# Altium integrated library connecteur 4.IntLib: 120 symbols (continued)
## WE-WR-MM Female Angled Connector with Polarization 690368172672 (continued)
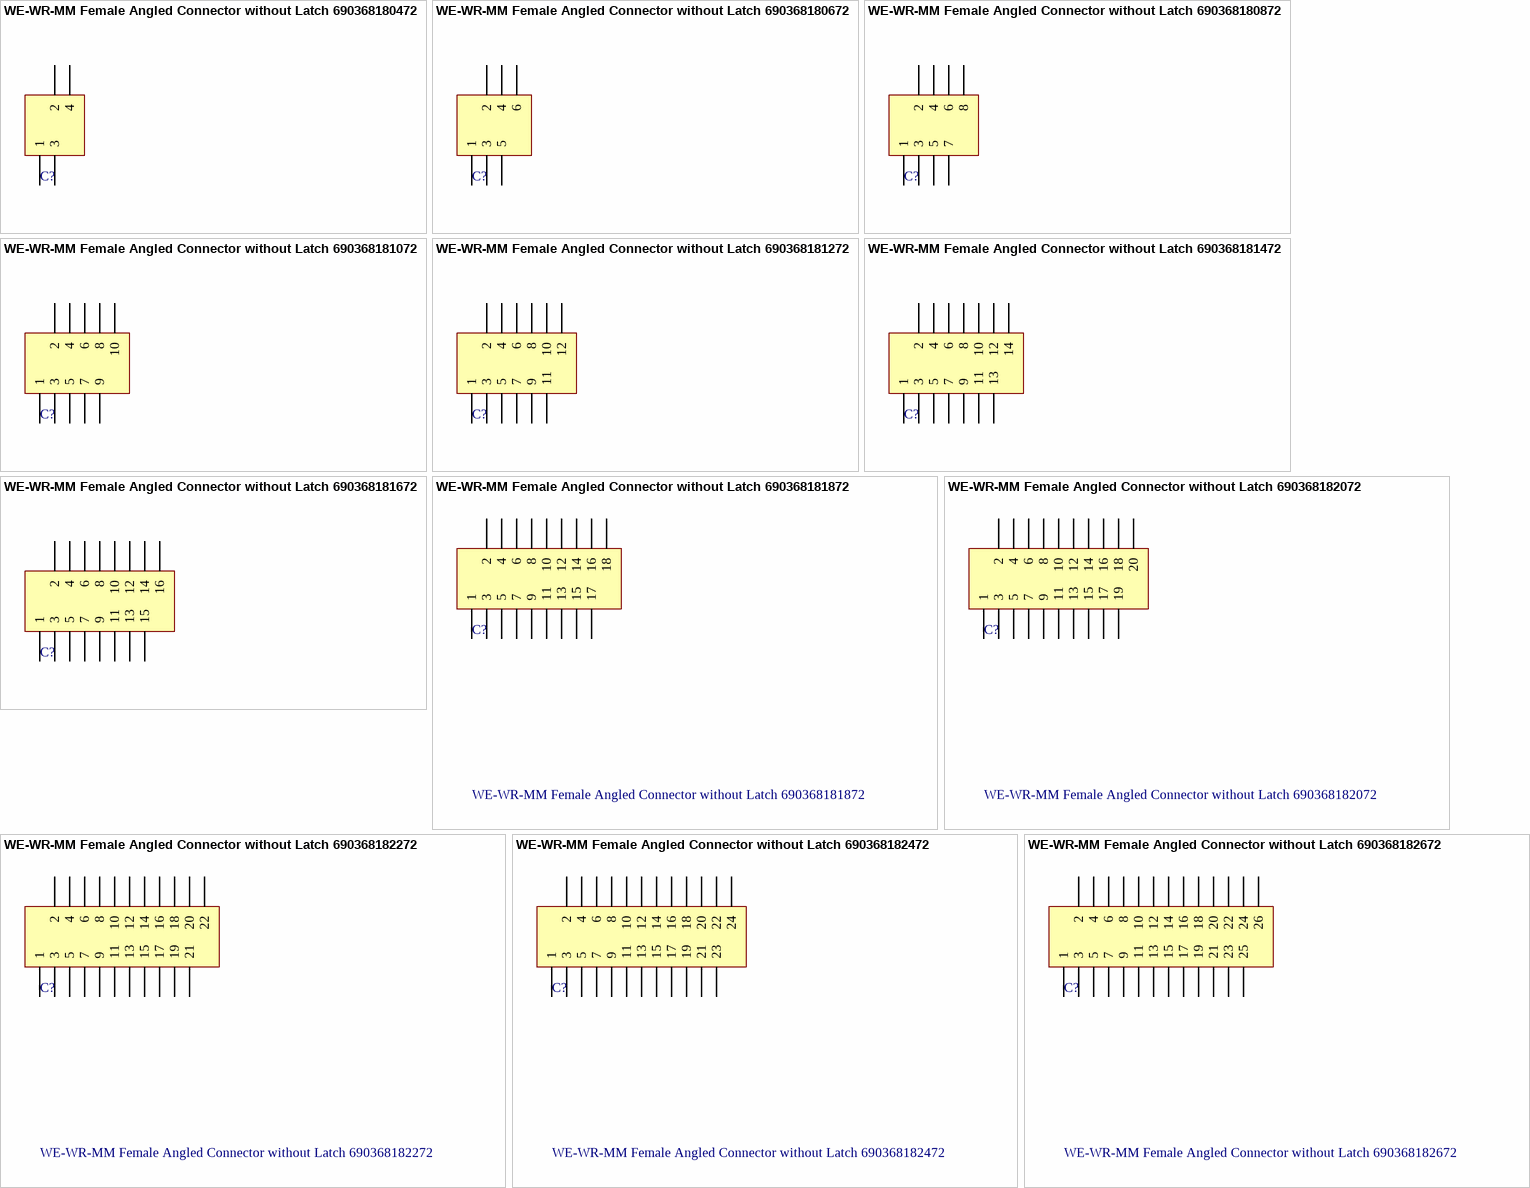
[diagram p5: symbols WE-WR-MM Female Angled Connector without Latch 690368180472 to WE-WR-MM Female Angled Connector without Latch 690368182672]

## WE-WR-MM Female Angled Connector without Latch 690368180472
designator C?
WR-MM Female Angled Connector without Latch; Manufacturer: Würth Elektronik eiSos GmbH; ComponentLink1 Description: Manufacturer; ComponentLink2 Description: Datasheet; NoPins: 4; Created Date: 18 April 2013; partNo: 690368180472; ComponentLink1URL: http://www.we-online.com; ComponentLink2URL: http://katalog.we-online.de/em/datasheet/69036818xx72.pdf; Created by: Karrer Zheng
footprint 690368180472 (without Polarization, 4 pins, right angled)
pins: 1, 2, 3, 4

## WE-WR-MM Female Angled Connector without Latch 690368180672
designator C?
WR-MM Female Angled Connector without Latch; Manufacturer: Würth Elektronik eiSos GmbH; ComponentLink1 Description: Manufacturer; ComponentLink2 Description: Datasheet; NoPins: 6; Created Date: 18 April 2013; partNo: 690368180672; ComponentLink1URL: http://www.we-online.com; ComponentLink2URL: http://katalog.we-online.de/em/datasheet/69036818xx72.pdf; Created by: Karrer Zheng
footprint 690368180672 (without Polarization, 6 pins, right angled)
pins: 1, 2, 3, 4, 5, 6

## WE-WR-MM Female Angled Connector without Latch 690368180872
designator C?
WR-MM Female Angled Connector without Latch; Manufacturer: Würth Elektronik eiSos GmbH; ComponentLink1 Description: Manufacturer; ComponentLink2 Description: Datasheet; NoPins: 8; Created Date: 18 April 2013; partNo: 690368180872; ComponentLink1URL: http://www.we-online.com; ComponentLink2URL: http://katalog.we-online.de/em/datasheet/69036818xx72.pdf; Created by: Karrer Zheng
footprint 690368180872 (without Polarization, 8 pins, right angled)
pins: 1, 2, 3, 4, 5, 6, 7, 8

## WE-WR-MM Female Angled Connector without Latch 690368181072
designator C?
WR-MM Female Angled Connector without Latch; Manufacturer: Würth Elektronik eiSos GmbH; ComponentLink1 Description: Manufacturer; ComponentLink2 Description: Datasheet; NoPins: 10; Created Date: 18 April 2013; partNo: 690368181072; ComponentLink1URL: http://www.we-online.com; ComponentLink2URL: http://katalog.we-online.de/em/datasheet/69036818xx72.pdf; Created by: Karrer Zheng
footprint 690368181072 (without Polarization, 10 pins, right angled)
pins: 1, 2, 3, 4, 5, 6, 7, 8, 9, 10

## WE-WR-MM Female Angled Connector without Latch 690368181272
designator C?
WR-MM Female Angled Connector without Latch; Manufacturer: Würth Elektronik eiSos GmbH; ComponentLink1 Description: Manufacturer; ComponentLink2 Description: Datasheet; NoPins: 12; Created Date: 18 April 2013; partNo: 690368181272; ComponentLink1URL: http://www.we-online.com; ComponentLink2URL: http://katalog.we-online.de/em/datasheet/69036818xx72.pdf; Created by: Karrer Zheng
footprint 690368181272 (without Polarization, 12 pins, right angled)
pins: 1, 2, 3, 4, 5, 6, 7, 8, 9, 10, 11, 12

## WE-WR-MM Female Angled Connector without Latch 690368181472
designator C?
WR-MM Female Angled Connector without Latch; Manufacturer: Würth Elektronik eiSos GmbH; ComponentLink1 Description: Manufacturer; ComponentLink2 Description: Datasheet; NoPins: 14; Created Date: 18 April 2013; partNo: 690368181472; ComponentLink1URL: http://www.we-online.com; ComponentLink2URL: http://katalog.we-online.de/em/datasheet/69036818xx72.pdf; Created by: Karrer Zheng
footprint 690368181472 (without Polarization,14 pins, right angled)
pins: 1, 2, 3, 4, 5, 6, 7, 8, 9, 10, 11, 12, 13, 14

## WE-WR-MM Female Angled Connector without Latch 690368181672
designator C?
WR-MM Female Angled Connector without Latch; Manufacturer: Würth Elektronik eiSos GmbH; ComponentLink1 Description: Manufacturer; ComponentLink2 Description: Datasheet; NoPins: 16; Created Date: 18 April 2013; partNo: 690368181672; ComponentLink1URL: http://www.we-online.com; ComponentLink2URL: http://katalog.we-online.de/em/datasheet/69036818xx72.pdf; Created by: Karrer Zheng
footprint 690368181672 (without Polarization, 16 pins, right angled)
pins: 1, 2, 3, 4, 5, 6, 7, 8, 9, 10, 11, 12, 13, 14, 15, 16

## WE-WR-MM Female Angled Connector without Latch 690368181872
designator C?
WR-MM Female Angled Connector without Latch; Manufacturer: Würth Elektronik eiSos GmbH; ComponentLink1 Description: Manufacturer; ComponentLink2 Description: Datasheet; NoPins: 18; Created Date: 18 April 2013; partNo: 690368181872; ComponentLink1URL: http://www.we-online.com; ComponentLink2URL: http://katalog.we-online.de/em/datasheet/69036818xx72.pdf; Created by: Karrer Zheng
footprint 690368181872 (without Polarization, 18 pins, right angled)
pins: 1, 2, 3, 4, 5, 6, 7, 8, 9, 10, 11, 12, 13, 14, 15, 16, 17, 18

## WE-WR-MM Female Angled Connector without Latch 690368182072
designator C?
WR-MM Female Angled Connector without Latch; Manufacturer: Würth Elektronik eiSos GmbH; ComponentLink1 Description: Manufacturer; ComponentLink2 Description: Datasheet; NoPins: 20; Created Date: 18 April 2013; partNo: 690368182072; ComponentLink1URL: http://www.we-online.com; ComponentLink2URL: http://katalog.we-online.de/em/datasheet/69036818xx72.pdf; Created by: Karrer Zheng
footprint 690368182072 (without Polarization, 20 pins, right angled)
pins: 1, 2, 3, 4, 5, 6, 7, 8, 9, 10, 11, 12, 13, 14, 15, 16, 17, 18, 19, 20

## WE-WR-MM Female Angled Connector without Latch 690368182272
designator C?
WR-MM Female Angled Connector without Latch; Manufacturer: Würth Elektronik eiSos GmbH; ComponentLink1 Description: Manufacturer; ComponentLink2 Description: Datasheet; NoPins: 22; Created Date: 18 April 2013; partNo: 690368182272; ComponentLink1URL: http://www.we-online.com; ComponentLink2URL: http://katalog.we-online.de/em/datasheet/69036818xx72.pdf; Created by: Karrer Zheng
footprint 690368182272 (without Polarization, 22 pins, right angled)
pins: 1, 2, 3, 4, 5, 6, 7, 8, 9, 10, 11, 12, 13, 14, 15, 16, 17, 18, 19, 20, 21, 22

## WE-WR-MM Female Angled Connector without Latch 690368182472
designator C?
WR-MM Female Angled Connector without Latch; Manufacturer: Würth Elektronik eiSos GmbH; ComponentLink1 Description: Manufacturer; ComponentLink2 Description: Datasheet; NoPins: 24; Created Date: 18 April 2013; partNo: 690368182472; ComponentLink1URL: http://www.we-online.com; ComponentLink2URL: http://katalog.we-online.de/em/datasheet/69036818xx72.pdf; Created by: Karrer Zheng
footprint 690368182472 (without Polarization, 24 pins, right angled)
pins: 1, 2, 3, 4, 5, 6, 7, 8, 9, 10, 11, 12, 13, 14, 15, 16, 17, 18, 19, 20, 21, 22, 23, 24

## WE-WR-MM Female Angled Connector without Latch 690368182672
designator C?
WR-MM Female Angled Connector without Latch; Manufacturer: Würth Elektronik eiSos GmbH; ComponentLink1 Description: Manufacturer; ComponentLink2 Description: Datasheet; NoPins: 26; Created Date: 18 April 2013; partNo: 690368182672; ComponentLink1URL: http://www.we-online.com; ComponentLink2URL: http://katalog.we-online.de/em/datasheet/69036818xx72.pdf; Created by: Karrer Zheng
footprint 690368182672 (without Polarization, 26 pins, right angled)
pins: 1, 2, 3, 4, 5, 6, 7, 8, 9, 10, 11, 12, 13, 14, 15, 16, 17, 18, 19, 20, 21, 22, 23, 24, 25, 26


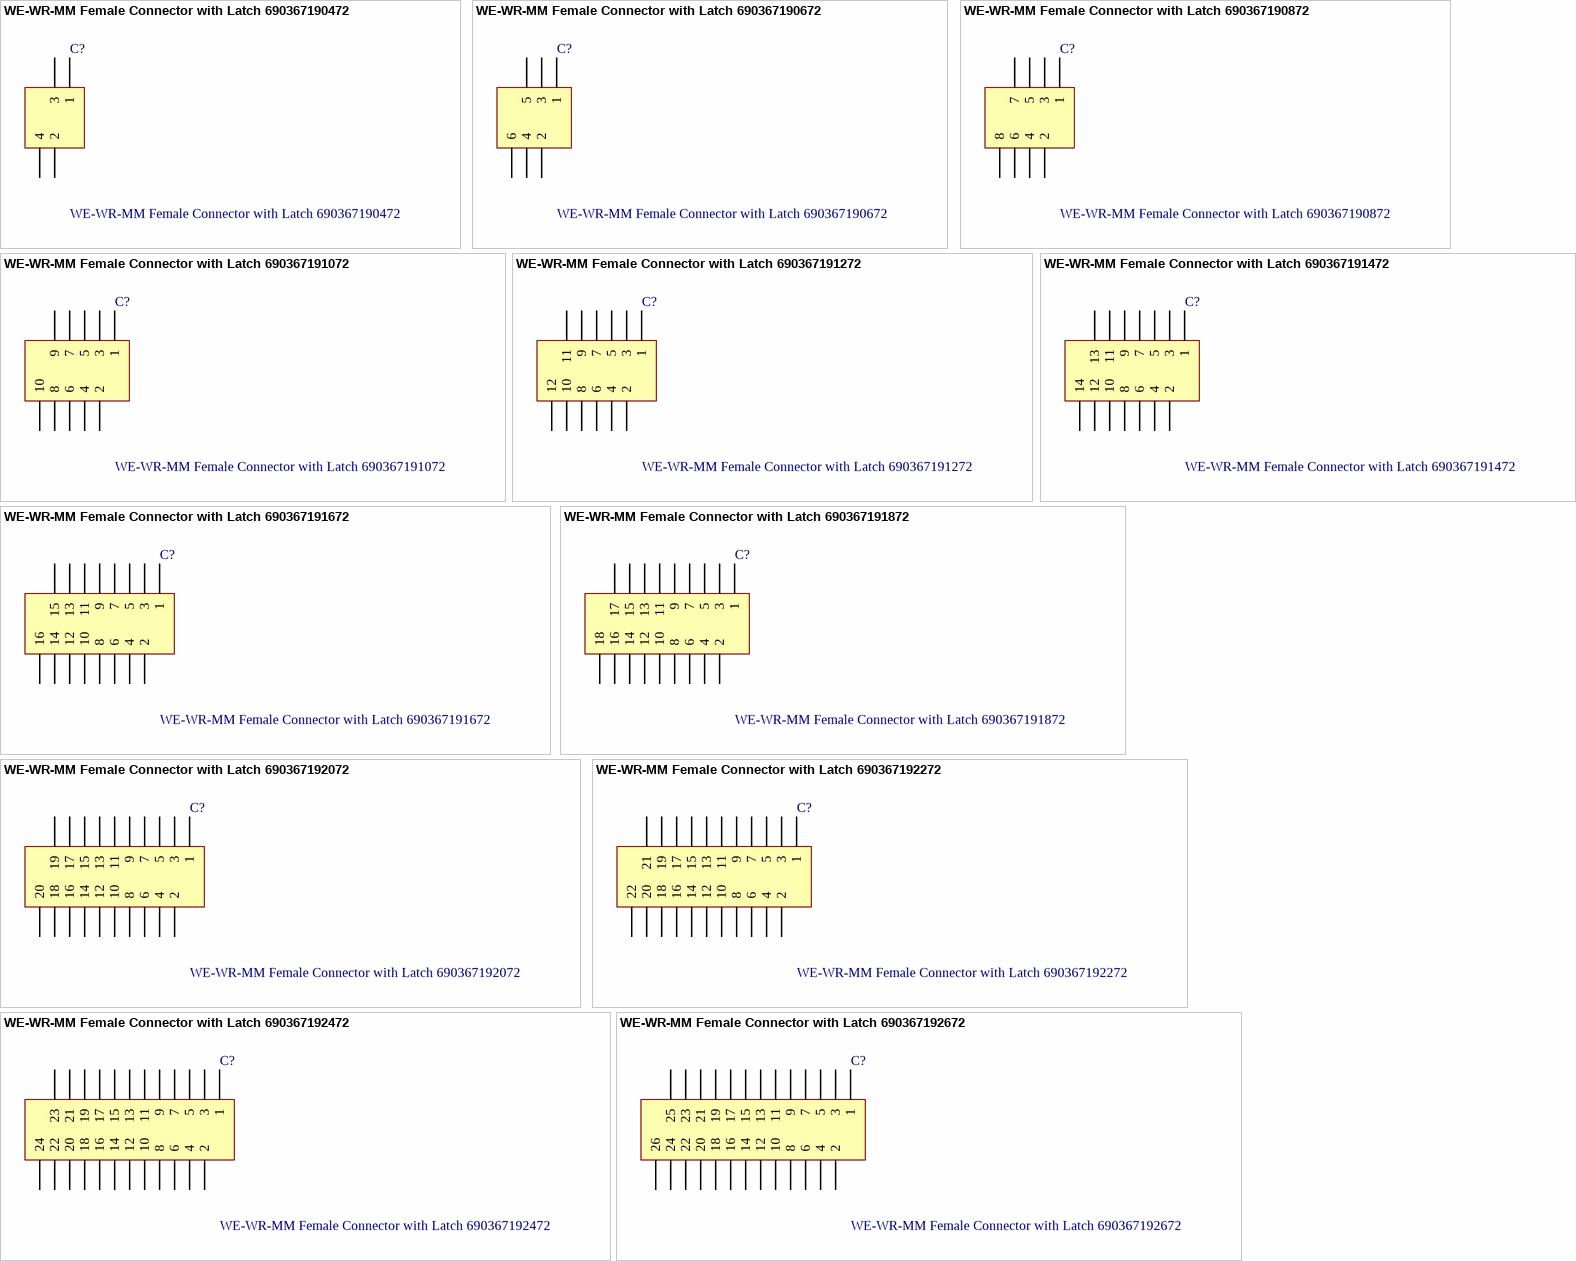
[diagram p6: symbols WE-WR-MM Female Connector with Latch 690367190472 to WE-WR-MM Female Connector with Latch 690367192672]

## WE-WR-MM Female Connector with Latch 690367190472
designator C?
WR-MM Female Connector with Latch; Manufacturer: Würth Elektronik eiSos GmbH; ComponentLink1 Description: Manufacturer; ComponentLink2 Description: Datasheet; NoPins: 4; Created Date: 17 April 2013; partNo: 690367190472; ComponentLink1URL: http://www.we-online.com; ComponentLink2URL: http://katalog.we-online.de/em/datasheet/69036719xx72.pdf; Created by: Karrer Zheng
footprint 690367190472 (without Polarization, 4 pins, straight)
pins: 1, 2, 3, 4

## WE-WR-MM Female Connector with Latch 690367190672
designator C?
WR-MM Female Connector with Latch; Manufacturer: Würth Elektronik eiSos GmbH; ComponentLink1 Description: Manufacturer; ComponentLink2 Description: Datasheet; NoPins: 6; Created Date: 17 April 2013; partNo: 690367190672; ComponentLink1URL: http://www.we-online.com; ComponentLink2URL: http://katalog.we-online.de/em/datasheet/69036719xx72.pdf; Created by: Karrer Zheng
footprint 690367190672 (without Polarization, 6 pins, straight)
pins: 1, 2, 3, 4, 5, 6

## WE-WR-MM Female Connector with Latch 690367190872
designator C?
WR-MM Female Connector with Latch; Manufacturer: Würth Elektronik eiSos GmbH; ComponentLink1 Description: Manufacturer; ComponentLink2 Description: Datasheet; NoPins: 8; Created Date: 17 April 2013; partNo: 690367190872; ComponentLink1URL: http://www.we-online.com; ComponentLink2URL: http://katalog.we-online.de/em/datasheet/69036719xx72.pdf; Created by: Karrer Zheng
footprint 690367190872 (without Polarization, 8 pins, straight)
pins: 1, 2, 3, 4, 5, 6, 7, 8

## WE-WR-MM Female Connector with Latch 690367191072
designator C?
WR-MM Female Connector with Latch; Manufacturer: Würth Elektronik eiSos GmbH; ComponentLink1 Description: Manufacturer; ComponentLink2 Description: Datasheet; NoPins: 10; Created Date: 17 April 2013; partNo: 690367191072; ComponentLink1URL: http://www.we-online.com; ComponentLink2URL: http://katalog.we-online.de/em/datasheet/69036719xx72.pdf; Created by: Karrer Zheng
footprint 690367191072 (without Polarization, 10 pins, straight)
pins: 1, 2, 3, 4, 5, 6, 7, 8, 9, 10

## WE-WR-MM Female Connector with Latch 690367191272
designator C?
WR-MM Female Connector with Latch; Manufacturer: Würth Elektronik eiSos GmbH; ComponentLink1 Description: Manufacturer; ComponentLink2 Description: Datasheet; NoPins: 12; Created Date: 17 April 2013; partNo: 690367191272; ComponentLink1URL: http://www.we-online.com; ComponentLink2URL: http://katalog.we-online.de/em/datasheet/69036719xx72.pdf; Created by: Karrer Zheng
footprint 690367191272 (without Polarization, 12 pins, straight)
pins: 1, 2, 3, 4, 5, 6, 7, 8, 9, 10, 11, 12

## WE-WR-MM Female Connector with Latch 690367191472
designator C?
WR-MM Female Connector with Latch; Manufacturer: Würth Elektronik eiSos GmbH; ComponentLink1 Description: Manufacturer; ComponentLink2 Description: Datasheet; NoPins: 14; Created Date: 17 April 2013; partNo: 690367191472; ComponentLink1URL: http://www.we-online.com; ComponentLink2URL: http://katalog.we-online.de/em/datasheet/69036719xx72.pdf; Created by: Karrer Zheng
footprint 690367191472 (without Polarization, 14 pins, straight)
pins: 1, 2, 3, 4, 5, 6, 7, 8, 9, 10, 11, 12, 13, 14

## WE-WR-MM Female Connector with Latch 690367191672
designator C?
WR-MM Female Connector with Latch; Manufacturer: Würth Elektronik eiSos GmbH; ComponentLink1 Description: Manufacturer; ComponentLink2 Description: Datasheet; NoPins: 16; Created Date: 17 April 2013; partNo: 690367191672; ComponentLink1URL: http://www.we-online.com; ComponentLink2URL: http://katalog.we-online.de/em/datasheet/69036719xx72.pdf; Created by: Karrer Zheng
footprint 690367191672 (without Polarization, 16 pins, straight)
pins: 1, 2, 3, 4, 5, 6, 7, 8, 9, 10, 11, 12, 13, 14, 15, 16

## WE-WR-MM Female Connector with Latch 690367191872
designator C?
WR-MM Female Connector with Latch; Manufacturer: Würth Elektronik eiSos GmbH; ComponentLink1 Description: Manufacturer; ComponentLink2 Description: Datasheet; NoPins: 18; Created Date: 17 April 2013; partNo: 690367191872; ComponentLink1URL: http://www.we-online.com; ComponentLink2URL: http://katalog.we-online.de/em/datasheet/69036719xx72.pdf; Created by: Karrer Zheng
footprint 690367191872 (without Polarization, 18 pins, straight)
pins: 1, 2, 3, 4, 5, 6, 7, 8, 9, 10, 11, 12, 13, 14, 15, 16, 17, 18

## WE-WR-MM Female Connector with Latch 690367192072
designator C?
WR-MM Female Connector with Latch; Manufacturer: Würth Elektronik eiSos GmbH; ComponentLink1 Description: Manufacturer; ComponentLink2 Description: Datasheet; NoPins: 20; Created Date: 17 April 2013; partNo: 690367192072; ComponentLink1URL: http://www.we-online.com; ComponentLink2URL: http://katalog.we-online.de/em/datasheet/69036719xx72.pdf; Created by: Karrer Zheng
footprint 690367192072 (without Polarization, 20 pins, straight)
pins: 1, 2, 3, 4, 5, 6, 7, 8, 9, 10, 11, 12, 13, 14, 15, 16, 17, 18, 19, 20

## WE-WR-MM Female Connector with Latch 690367192272
designator C?
WR-MM Female Connector with Latch; Manufacturer: Würth Elektronik eiSos GmbH; ComponentLink1 Description: Manufacturer; ComponentLink2 Description: Datasheet; NoPins: 22; Created Date: 17 April 2013; partNo: 690367192272; ComponentLink1URL: http://www.we-online.com; ComponentLink2URL: http://katalog.we-online.de/em/datasheet/69036719xx72.pdf; Created by: Karrer Zheng
footprint 690367192272 (without Polarization, 22 pins, straight)
pins: 1, 2, 3, 4, 5, 6, 7, 8, 9, 10, 11, 12, 13, 14, 15, 16, 17, 18, 19, 20, 21, 22

## WE-WR-MM Female Connector with Latch 690367192472
designator C?
WR-MM Female Connector with Latch; Manufacturer: Würth Elektronik eiSos GmbH; ComponentLink1 Description: Manufacturer; ComponentLink2 Description: Datasheet; NoPins: 24; Created Date: 17 April 2013; partNo: 690367192472; ComponentLink1URL: http://www.we-online.com; ComponentLink2URL: http://katalog.we-online.de/em/datasheet/69036719xx72.pdf; Created by: Karrer Zheng
footprint 690367192472 (without Polarization, 24 pins, straight)
pins: 1, 2, 3, 4, 5, 6, 7, 8, 9, 10, 11, 12, 13, 14, 15, 16, 17, 18, 19, 20, 21, 22, 23, 24

## WE-WR-MM Female Connector with Latch 690367192672
designator C?
WR-MM Female Connector with Latch; Manufacturer: Würth Elektronik eiSos GmbH; ComponentLink1 Description: Manufacturer; ComponentLink2 Description: Datasheet; NoPins: 26; Created Date: 17 April 2013; partNo: 690367192672; ComponentLink1URL: http://www.we-online.com; ComponentLink2URL: http://katalog.we-online.de/em/datasheet/69036719xx72.pdf; Created by: Karrer Zheng
footprint 690367192672 (without Polarization, 26 pins, straight)
pins: 1, 2, 3, 4, 5, 6, 7, 8, 9, 10, 11, 12, 13, 14, 15, 16, 17, 18, 19, 20, 21, 22, 23, 24, 25, 26


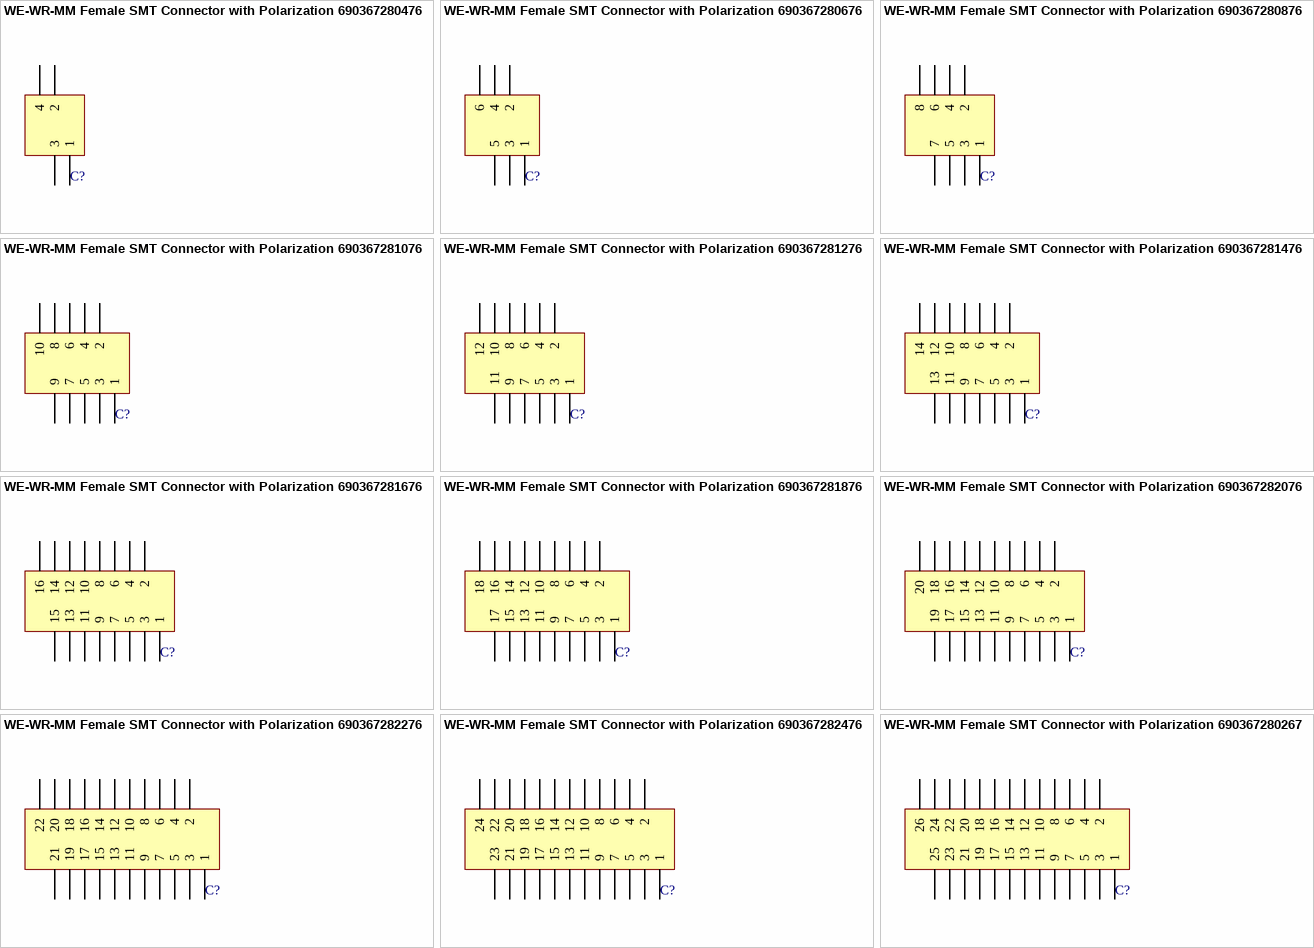
[diagram p7: symbols WE-WR-MM Female SMT Connector with Polarization 690367280476 to WE-WR-MM Female SMT Connector with Polarization 6903672802676]

## WE-WR-MM Female SMT Connector with Polarization 690367280476
designator C?
WR-MM Female SMT Connector with Polarization; Manufacturer: Würth Elektronik eiSos GmbH; ComponentLink1 Description: Manufacturer; ComponentLink2 Description: Datasheet; NoPins: 4; Created Date: 17 April 2013; partNo: 690367280476; ComponentLink1URL: http://www.we-online.com; ComponentLink2URL: http://katalog.we-online.de/em/datasheet/69036728xx76.pdf; Created by: Karrer Zheng
footprint 690367280476 (without Latch, 4 pins, SMT, straight)
pins: 1, 2, 3, 4

## WE-WR-MM Female SMT Connector with Polarization 690367280676
designator C?
WR-MM Female SMT Connector with Polarization; Manufacturer: Würth Elektronik eiSos GmbH; ComponentLink1 Description: Manufacturer; ComponentLink2 Description: Datasheet; NoPins: 6; Created Date: 17 April 2013; partNo: 690367280676; ComponentLink1URL: http://www.we-online.com; ComponentLink2URL: http://katalog.we-online.de/em/datasheet/69036728xx76.pdf; Created by: Karrer Zheng
footprint 690367280676 (without Latch, 6 pins, SMT, straight)
pins: 1, 2, 3, 4, 5, 6

## WE-WR-MM Female SMT Connector with Polarization 690367280876
designator C?
WR-MM Female SMT Connector with Polarization; Manufacturer: Würth Elektronik eiSos GmbH; ComponentLink1 Description: Manufacturer; ComponentLink2 Description: Datasheet; NoPins: 8; Created Date: 17 April 2013; partNo: 690367280876; ComponentLink1URL: http://www.we-online.com; ComponentLink2URL: http://katalog.we-online.de/em/datasheet/69036728xx76.pdf; Created by: Karrer Zheng
footprint 690367280876 (without Latch, 8 pins, SMT, straight)
pins: 1, 2, 3, 4, 5, 6, 7, 8

## WE-WR-MM Female SMT Connector with Polarization 690367281076
designator C?
WR-MM Female SMT Connector with Polarization; Manufacturer: Würth Elektronik eiSos GmbH; ComponentLink1 Description: Manufacturer; ComponentLink2 Description: Datasheet; NoPins: 10; Created Date: 17 April 2013; partNo: 690367281076; ComponentLink1URL: http://www.we-online.com; ComponentLink2URL: http://katalog.we-online.de/em/datasheet/69036728xx76.pdf; Created by: Karrer Zheng
footprint 690367281076 (without Latch, 10 pins, SMT, straight)
pins: 1, 2, 3, 4, 5, 6, 7, 8, 9, 10

## WE-WR-MM Female SMT Connector with Polarization 690367281276
designator C?
WR-MM Female SMT Connector with Polarization; Manufacturer: Würth Elektronik eiSos GmbH; ComponentLink1 Description: Manufacturer; ComponentLink2 Description: Datasheet; NoPins: 12; Created Date: 17 April 2013; partNo: 690367281276; ComponentLink1URL: http://www.we-online.com; ComponentLink2URL: http://katalog.we-online.de/em/datasheet/69036728xx76.pdf; Created by: Karrer Zheng
footprint 690367281276 (without Latch, 12 pins, SMT, straight)
pins: 1, 2, 3, 4, 5, 6, 7, 8, 9, 10, 11, 12

## WE-WR-MM Female SMT Connector with Polarization 690367281476
designator C?
WR-MM Female SMT Connector with Polarization; Manufacturer: Würth Elektronik eiSos GmbH; ComponentLink1 Description: Manufacturer; ComponentLink2 Description: Datasheet; NoPins: 14; Created Date: 17 April 2013; partNo: 690367281476; ComponentLink1URL: http://www.we-online.com; ComponentLink2URL: http://katalog.we-online.de/em/datasheet/69036728xx76.pdf; Created by: Karrer Zheng
footprint 690367281476 (without Latch, 14 pins, SMT, straight)
pins: 1, 2, 3, 4, 5, 6, 7, 8, 9, 10, 11, 12, 13, 14

## WE-WR-MM Female SMT Connector with Polarization 690367281676
designator C?
WR-MM Female SMT Connector with Polarization; Manufacturer: Würth Elektronik eiSos GmbH; ComponentLink1 Description: Manufacturer; ComponentLink2 Description: Datasheet; NoPins: 16; Created Date: 17 April 2013; partNo: 690367281676; ComponentLink1URL: http://www.we-online.com; ComponentLink2URL: http://katalog.we-online.de/em/datasheet/69036728xx76.pdf; Created by: Karrer Zheng
footprint 690367281676 (without Latch, 16 pins, SMT, straight)
pins: 1, 2, 3, 4, 5, 6, 7, 8, 9, 10, 11, 12, 13, 14, 15, 16

## WE-WR-MM Female SMT Connector with Polarization 690367281876
designator C?
WR-MM Female SMT Connector with Polarization; Manufacturer: Würth Elektronik eiSos GmbH; ComponentLink1 Description: Manufacturer; ComponentLink2 Description: Datasheet; NoPins: 18; Created Date: 17 April 2013; partNo: 690367281876; ComponentLink1URL: http://www.we-online.com; ComponentLink2URL: http://katalog.we-online.de/em/datasheet/69036728xx76.pdf; Created by: Karrer Zheng
footprint 690367281876 (without Latch, 18 pins, SMT, straight)
pins: 1, 2, 3, 4, 5, 6, 7, 8, 9, 10, 11, 12, 13, 14, 15, 16, 17, 18

## WE-WR-MM Female SMT Connector with Polarization 690367282076
designator C?
WR-MM Female SMT Connector with Polarization; Manufacturer: Würth Elektronik eiSos GmbH; ComponentLink1 Description: Manufacturer; ComponentLink2 Description: Datasheet; NoPins: 20; Created Date: 17 April 2013; partNo: 690367282076; ComponentLink1URL: http://www.we-online.com; ComponentLink2URL: http://katalog.we-online.de/em/datasheet/69036728xx76.pdf; Created by: Karrer Zheng
footprint 690367282076 (without Latch, 20 pins, SMT, straight)
pins: 1, 2, 3, 4, 5, 6, 7, 8, 9, 10, 11, 12, 13, 14, 15, 16, 17, 18, 19, 20

## WE-WR-MM Female SMT Connector with Polarization 690367282276
designator C?
WR-MM Female SMT Connector with Polarization; Manufacturer: Würth Elektronik eiSos GmbH; ComponentLink1 Description: Manufacturer; ComponentLink2 Description: Datasheet; NoPins: 22; Created Date: 17 April 2013; partNo: 690367282276; ComponentLink1URL: http://www.we-online.com; ComponentLink2URL: http://katalog.we-online.de/em/datasheet/69036728xx76.pdf; Created by: Karrer Zheng
footprint 690367282276 (without Latch, 22 pins, SMT, straight)
pins: 1, 2, 3, 4, 5, 6, 7, 8, 9, 10, 11, 12, 13, 14, 15, 16, 17, 18, 19, 20, 21, 22

## WE-WR-MM Female SMT Connector with Polarization 690367282476
designator C?
WR-MM Female SMT Connector with Polarization; Manufacturer: Würth Elektronik eiSos GmbH; ComponentLink1 Description: Manufacturer; ComponentLink2 Description: Datasheet; NoPins: 24; Created Date: 17 April 2013; partNo: 690367282476; ComponentLink1URL: http://www.we-online.com; ComponentLink2URL: http://katalog.we-online.de/em/datasheet/69036728xx76.pdf; Created by: Karrer Zheng
footprint 690367282476 (without Latch, 24 pins, SMT, straight)
pins: 1, 2, 3, 4, 5, 6, 7, 8, 9, 10, 11, 12, 13, 14, 15, 16, 17, 18, 19, 20, 21, 22, 23, 24

## WE-WR-MM Female SMT Connector with Polarization 6903672802676
designator C?
WR-MM Female SMT Connector with Polarization; Manufacturer: Würth Elektronik eiSos GmbH; ComponentLink1 Description: Manufacturer; ComponentLink2 Description: Datasheet; NoPins: 26; Created Date: 17 April 2013; partNo: 6903672802676; ComponentLink1URL: http://www.we-online.com; ComponentLink2URL: http://katalog.we-online.de/em/datasheet/69036728xx76.pdf; Created by: Karrer Zheng
footprint 690367282676 (without Latch, 26 pins, SMT, straight)
pins: 1, 2, 3, 4, 5, 6, 7, 8, 9, 10, 11, 12, 13, 14, 15, 16, 17, 18, 19, 20, 21, 22, 23, 24, 25, 26


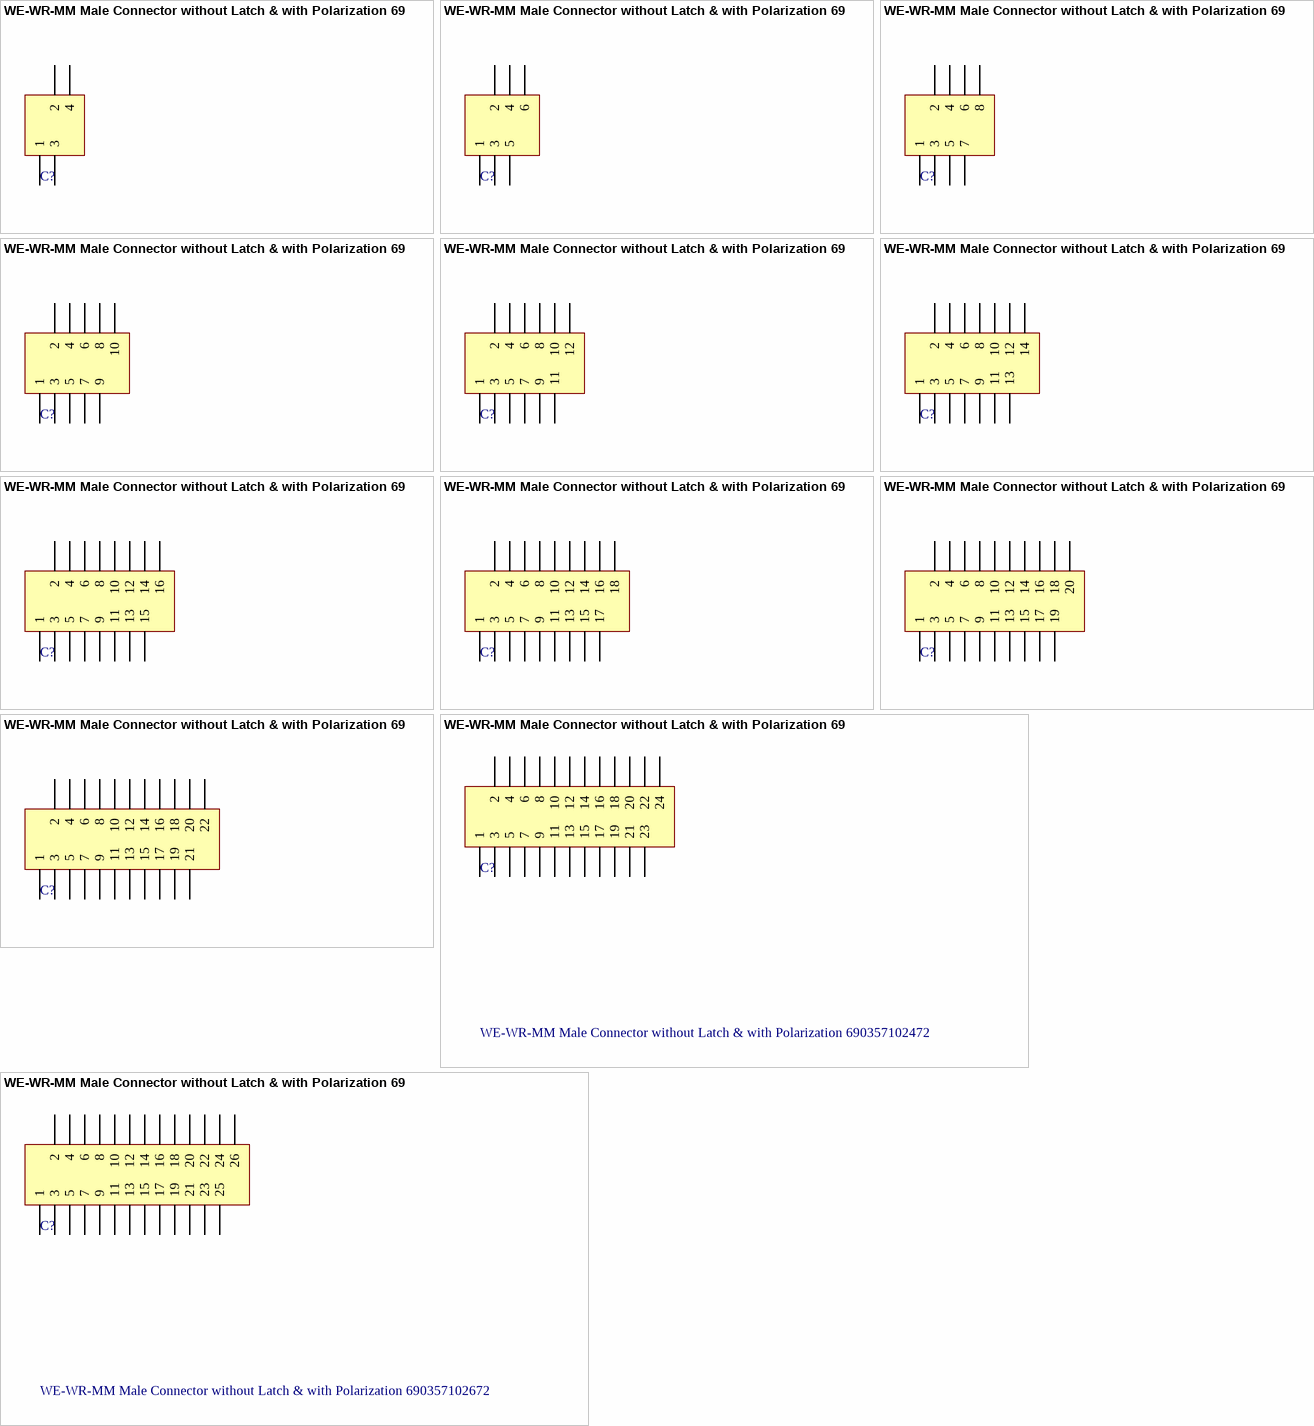
[diagram p8: symbols WE-WR-MM Male Connector without Latch & with Polarization 690357100472 to WE-WR-MM Male Connector without Latch & with Polarization 690357102672]

## WE-WR-MM Male Connector without Latch & with Polarization 690357100472
designator C?
WR-MM Male Connector without Latch & with Polarization; Manufacturer: Würth Elektronik eiSos GmbH; ComponentLink1 Description: Manufacturer; ComponentLink2 Description: Datasheet; NoPins: 4; Created Date: 19 April 2013; partNo: 690357100472; ComponentLink1URL: http://www.we-online.com; ComponentLink2URL: http://katalog.we-online.de/em/datasheet/69035710xx72.pdf; Created by: Karrer Zheng
footprint 690357100472 (4 pins, straight)
pins: 1, 2, 3, 4

## WE-WR-MM Male Connector without Latch & with Polarization 690357100672
designator C?
WR-MM Male Connector without Latch & with Polarization; Manufacturer: Würth Elektronik eiSos GmbH; ComponentLink1 Description: Manufacturer; ComponentLink2 Description: Datasheet; NoPins: 6; Created Date: 19 April 2013; partNo: 690357100672; ComponentLink1URL: http://www.we-online.com; ComponentLink2URL: http://katalog.we-online.de/em/datasheet/69035710xx72.pdf; Created by: Karrer Zheng
footprint 690357100672 (6 pins, straight)
pins: 1, 2, 3, 4, 5, 6

## WE-WR-MM Male Connector without Latch & with Polarization 690357100872
designator C?
WR-MM Male Connector without Latch & with Polarization; Manufacturer: Würth Elektronik eiSos GmbH; ComponentLink1 Description: Manufacturer; ComponentLink2 Description: Datasheet; NoPins: 8; Created Date: 19 April 2013; partNo: 690357100872; ComponentLink1URL: http://www.we-online.com; ComponentLink2URL: http://katalog.we-online.de/em/datasheet/69035710xx72.pdf; Created by: Karrer Zheng
footprint 690357100872 (8 pins, straight)
pins: 1, 2, 3, 4, 5, 6, 7, 8

## WE-WR-MM Male Connector without Latch & with Polarization 690357101072
designator C?
WR-MM Male Connector without Latch & with Polarization; Manufacturer: Würth Elektronik eiSos GmbH; ComponentLink1 Description: Manufacturer; ComponentLink2 Description: Datasheet; NoPins: 10; Created Date: 19 April 2013; partNo: 690357101072; ComponentLink1URL: http://www.we-online.com; ComponentLink2URL: http://katalog.we-online.de/em/datasheet/69035710xx72.pdf; Created by: Karrer Zheng
footprint 690357101072 (10 pins, straight)
pins: 1, 2, 3, 4, 5, 6, 7, 8, 9, 10

## WE-WR-MM Male Connector without Latch & with Polarization 690357101272
designator C?
WR-MM Male Connector without Latch & with Polarization; Manufacturer: Würth Elektronik eiSos GmbH; ComponentLink1 Description: Manufacturer; ComponentLink2 Description: Datasheet; NoPins: 12; Created Date: 19 April 2013; partNo: 690357101272; ComponentLink1URL: http://www.we-online.com; ComponentLink2URL: http://katalog.we-online.de/em/datasheet/69035710xx72.pdf; Created by: Karrer Zheng
footprint 690357101272 (12 pins, straight)
pins: 1, 2, 3, 4, 5, 6, 7, 8, 9, 10, 11, 12

## WE-WR-MM Male Connector without Latch & with Polarization 690357101472
designator C?
WR-MM Male Connector without Latch & with Polarization; Manufacturer: Würth Elektronik eiSos GmbH; ComponentLink1 Description: Manufacturer; ComponentLink2 Description: Datasheet; NoPins: 14; Created Date: 19 April 2013; partNo: 690357101472; ComponentLink1URL: http://www.we-online.com; ComponentLink2URL: http://katalog.we-online.de/em/datasheet/69035710xx72.pdf; Created by: Karrer Zheng
footprint 690357101472 (14 pins, straight)
pins: 1, 2, 3, 4, 5, 6, 7, 8, 9, 10, 11, 12, 13, 14

## WE-WR-MM Male Connector without Latch & with Polarization 690357101672
designator C?
WR-MM Male Connector without Latch & with Polarization; Manufacturer: Würth Elektronik eiSos GmbH; ComponentLink1 Description: Manufacturer; ComponentLink2 Description: Datasheet; NoPins: 16; Created Date: 19 April 2013; partNo: 690357101672; ComponentLink1URL: http://www.we-online.com; ComponentLink2URL: http://katalog.we-online.de/em/datasheet/69035710xx72.pdf; Created by: Karrer Zheng
footprint 690357101672 (16 pins, straight)
pins: 1, 2, 3, 4, 5, 6, 7, 8, 9, 10, 11, 12, 13, 14, 15, 16

## WE-WR-MM Male Connector without Latch & with Polarization 690357101872
designator C?
WR-MM Male Connector without Latch & with Polarization; Manufacturer: Würth Elektronik eiSos GmbH; ComponentLink1 Description: Manufacturer; ComponentLink2 Description: Datasheet; NoPins: 18; Created Date: 19 April 2013; partNo: 690357101872; ComponentLink1URL: http://www.we-online.com; ComponentLink2URL: http://katalog.we-online.de/em/datasheet/69035710xx72.pdf; Created by: Karrer Zheng
footprint 690357101872 (18 pins, straight)
pins: 1, 2, 3, 4, 5, 6, 7, 8, 9, 10, 11, 12, 13, 14, 15, 16, 17, 18

## WE-WR-MM Male Connector without Latch & with Polarization 690357102072
designator C?
WR-MM Male Connector without Latch & with Polarization; Manufacturer: Würth Elektronik eiSos GmbH; ComponentLink1 Description: Manufacturer; ComponentLink2 Description: Datasheet; NoPins: 20; Created Date: 19 April 2013; partNo: 690357102072; ComponentLink1URL: http://www.we-online.com; ComponentLink2URL: http://katalog.we-online.de/em/datasheet/69035710xx72.pdf; Created by: Karrer Zheng
footprint 690357102072 (20 pins, straight)
pins: 1, 2, 3, 4, 5, 6, 7, 8, 9, 10, 11, 12, 13, 14, 15, 16, 17, 18, 19, 20

## WE-WR-MM Male Connector without Latch & with Polarization 690357102272
designator C?
WR-MM Male Connector without Latch & with Polarization; Manufacturer: Würth Elektronik eiSos GmbH; ComponentLink1 Description: Manufacturer; ComponentLink2 Description: Datasheet; NoPins: 22; Created Date: 19 April 2013; partNo: 690357102272; ComponentLink1URL: http://www.we-online.com; ComponentLink2URL: http://katalog.we-online.de/em/datasheet/69035710xx72.pdf; Created by: Karrer Zheng
footprint 690357102272 (22 pins, straight)
pins: 1, 2, 3, 4, 5, 6, 7, 8, 9, 10, 11, 12, 13, 14, 15, 16, 17, 18, 19, 20, 21, 22

## WE-WR-MM Male Connector without Latch & with Polarization 690357102472
designator C?
WR-MM Male Connector without Latch & with Polarization; Manufacturer: Würth Elektronik eiSos GmbH; ComponentLink1 Description: Manufacturer; ComponentLink2 Description: Datasheet; NoPins: 24; Created Date: 19 April 2013; partNo: 690357102472; ComponentLink1URL: http://www.we-online.com; ComponentLink2URL: http://katalog.we-online.de/em/datasheet/69035710xx72.pdf; Created by: Karrer Zheng
footprint 690357102472 (24 pins, straight)
pins: 1, 2, 3, 4, 5, 6, 7, 8, 9, 10, 11, 12, 13, 14, 15, 16, 17, 18, 19, 20, 21, 22, 23, 24

## WE-WR-MM Male Connector without Latch & with Polarization 690357102672
designator C?
WR-MM Male Connector without Latch & with Polarization; Manufacturer: Würth Elektronik eiSos GmbH; ComponentLink1 Description: Manufacturer; ComponentLink2 Description: Datasheet; NoPins: 26; Created Date: 19 April 2013; partNo: 690357102672; ComponentLink1URL: http://www.we-online.com; ComponentLink2URL: http://katalog.we-online.de/em/datasheet/69035710xx72.pdf; Created by: Karrer Zheng
footprint 690357102672 (26 pins, straight)
pins: 1, 2, 3, 4, 5, 6, 7, 8, 9, 10, 11, 12, 13, 14, 15, 16, 17, 18, 19, 20, 21, 22, 23, 24, 25, 26


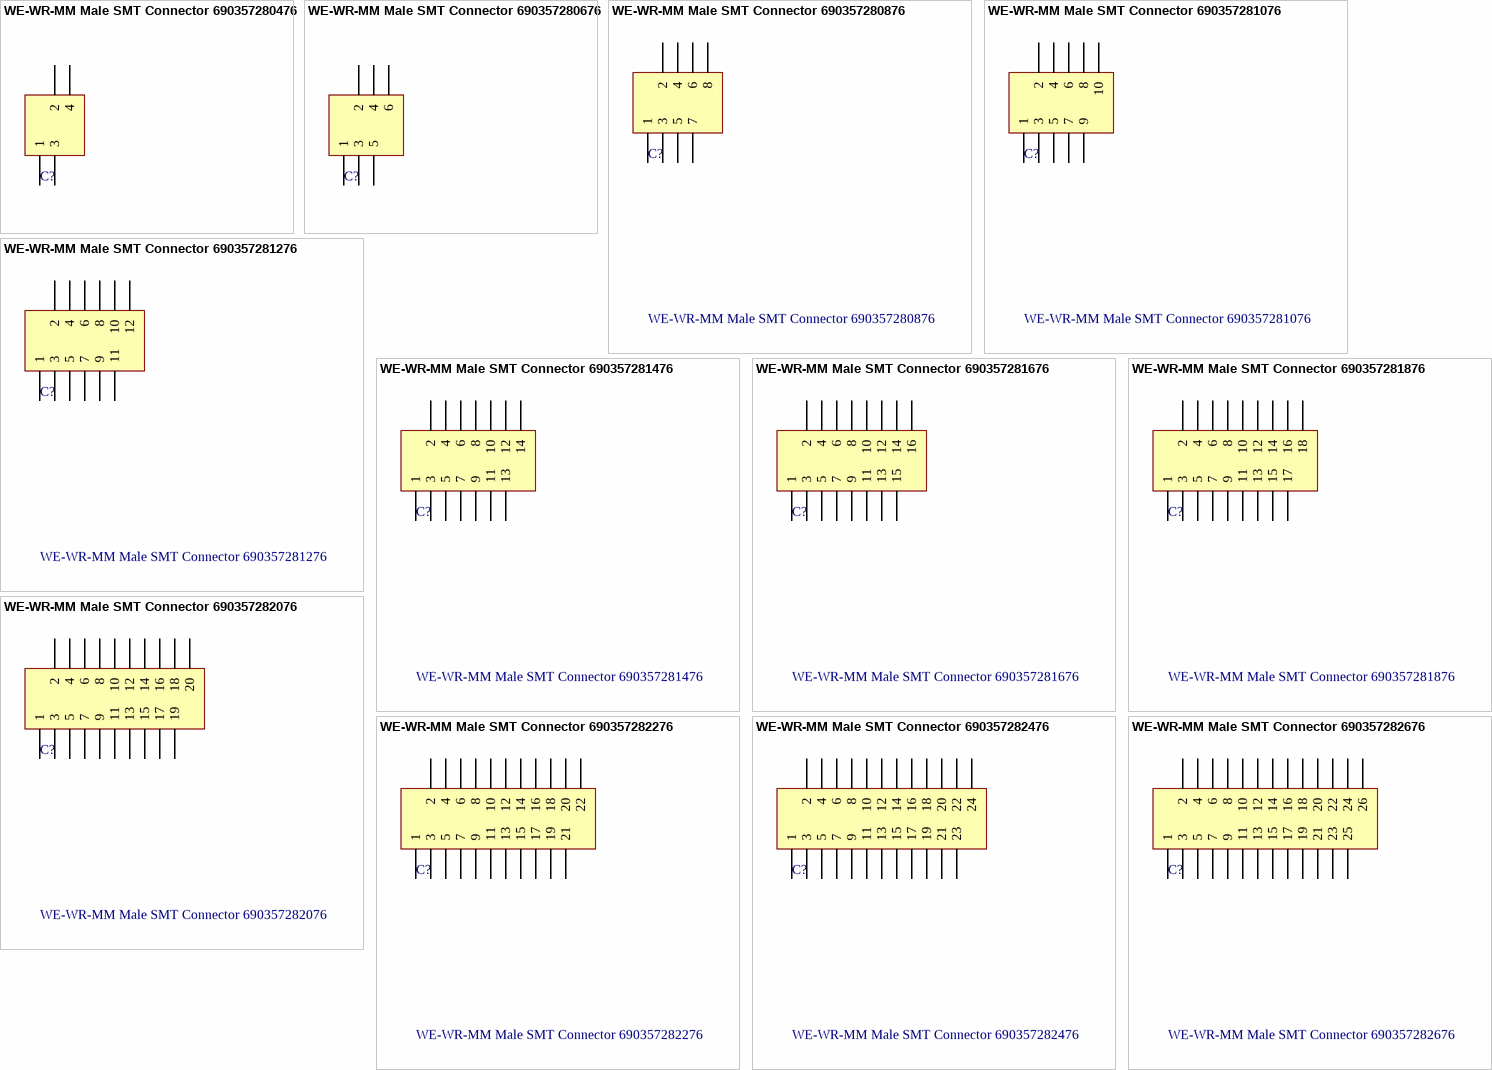
[diagram p9: symbols WE-WR-MM Male SMT Connector 690357280476 to WE-WR-MM Male SMT Connector 690357282676]

## WE-WR-MM Male SMT Connector 690357280476
designator C?
WR-MM Male SMT Connector; Manufacturer: Würth Elektronik eiSos GmbH; ComponentLink1 Description: Manufacturer; ComponentLink2 Description: Datasheet; NoPins: 4; Created Date: 18 April 2013; partNo: 690357280476; ComponentLink1URL: http://www.we-online.com; ComponentLink2URL: http://katalog.we-online.de/em/datasheet/69035728xx76.pdf; Created by: Karrer Zheng
footprint 690357280476 (4 pins, SMT, straight)
pins: 1, 2, 3, 4

## WE-WR-MM Male SMT Connector 690357280676
designator C?
WR-MM Male SMT Connector; Manufacturer: Würth Elektronik eiSos GmbH; ComponentLink1 Description: Manufacturer; ComponentLink2 Description: Datasheet; NoPins: 6; Created Date: 18 April 2013; partNo: 690357280676; ComponentLink1URL: http://www.we-online.com; ComponentLink2URL: http://katalog.we-online.de/em/datasheet/69035728xx76.pdf; Created by: Karrer Zheng
footprint 690357280676 (6 pins, SMT, straight)
pins: 1, 2, 3, 4, 5, 6

## WE-WR-MM Male SMT Connector 690357280876
designator C?
WR-MM Male SMT Connector; Manufacturer: Würth Elektronik eiSos GmbH; ComponentLink1 Description: Manufacturer; ComponentLink2 Description: Datasheet; NoPins: 8; Created Date: 18 April 2013; partNo: 690357280876; ComponentLink1URL: http://www.we-online.com; ComponentLink2URL: http://katalog.we-online.de/em/datasheet/69035728xx76.pdf; Created by: Karrer Zheng
footprint 690357280876 (8 pins, SMT, straight)
pins: 1, 2, 3, 4, 5, 6, 7, 8

## WE-WR-MM Male SMT Connector 690357281076
designator C?
WR-MM Male SMT Connector; Manufacturer: Würth Elektronik eiSos GmbH; ComponentLink1 Description: Manufacturer; ComponentLink2 Description: Datasheet; NoPins: 10; Created Date: 18 April 2013; partNo: 690357281076; ComponentLink1URL: http://www.we-online.com; ComponentLink2URL: http://katalog.we-online.de/em/datasheet/69035728xx76.pdf; Created by: Karrer Zheng
footprint 690357281076 (10 pins, SMT, straight)
pins: 1, 2, 3, 4, 5, 6, 7, 8, 9, 10

## WE-WR-MM Male SMT Connector 690357281276
designator C?
WR-MM Male SMT Connector; Manufacturer: Würth Elektronik eiSos GmbH; ComponentLink1 Description: Manufacturer; ComponentLink2 Description: Datasheet; NoPins: 4; Created Date: 18 April 2013; partNo: 690357281276; ComponentLink1URL: http://www.we-online.com; ComponentLink2URL: http://katalog.we-online.de/em/datasheet/69035728xx76.pdf; Created by: Karrer Zheng
footprint 690357281276 (12 pins, SMT, straight)
pins: 1, 2, 3, 4, 5, 6, 7, 8, 9, 10, 11, 12

## WE-WR-MM Male SMT Connector 690357281476
designator C?
WR-MM Male SMT Connector; Manufacturer: Würth Elektronik eiSos GmbH; ComponentLink1 Description: Manufacturer; ComponentLink2 Description: Datasheet; NoPins: 14; Created Date: 18 April 2013; partNo: 690357281476; ComponentLink1URL: http://www.we-online.com; ComponentLink2URL: http://katalog.we-online.de/em/datasheet/69035728xx76.pdf; Created by: Karrer Zheng
footprint 690357281476 (14 pins, SMT, straight)
pins: 1, 2, 3, 4, 5, 6, 7, 8, 9, 10, 11, 12, 13, 14

## WE-WR-MM Male SMT Connector 690357281676
designator C?
WR-MM Male SMT Connector; Manufacturer: Würth Elektronik eiSos GmbH; ComponentLink1 Description: Manufacturer; ComponentLink2 Description: Datasheet; NoPins: 16; Created Date: 18 April 2013; partNo: 690357281676; ComponentLink1URL: http://www.we-online.com; ComponentLink2URL: http://katalog.we-online.de/em/datasheet/69035728xx76.pdf; Created by: Karrer Zheng
footprint 690357281676 (16 pins, SMT, straight)
pins: 1, 2, 3, 4, 5, 6, 7, 8, 9, 10, 11, 12, 13, 14, 15, 16

## WE-WR-MM Male SMT Connector 690357281876
designator C?
WR-MM Male SMT Connector; Manufacturer: Würth Elektronik eiSos GmbH; ComponentLink1 Description: Manufacturer; ComponentLink2 Description: Datasheet; NoPins: 18; Created Date: 18 April 2013; partNo: 690357281876; ComponentLink1URL: http://www.we-online.com; ComponentLink2URL: http://katalog.we-online.de/em/datasheet/69035728xx76.pdf; Created by: Karrer Zheng
footprint 690357281876 (18 pins, SMT, straight)
pins: 1, 2, 3, 4, 5, 6, 7, 8, 9, 10, 11, 12, 13, 14, 15, 16, 17, 18

## WE-WR-MM Male SMT Connector 690357282076
designator C?
WR-MM Male SMT Connector; Manufacturer: Würth Elektronik eiSos GmbH; ComponentLink1 Description: Manufacturer; ComponentLink2 Description: Datasheet; NoPins: 20; Created Date: 18 April 2013; partNo: 690357282076; ComponentLink1URL: http://www.we-online.com; ComponentLink2URL: http://katalog.we-online.de/em/datasheet/69035728xx76.pdf; Created by: Karrer Zheng
footprint 690357282076 (20 pins, SMT, straight)
pins: 1, 2, 3, 4, 5, 6, 7, 8, 9, 10, 11, 12, 13, 14, 15, 16, 17, 18, 19, 20

## WE-WR-MM Male SMT Connector 690357282276
designator C?
WR-MM Male SMT Connector; Manufacturer: Würth Elektronik eiSos GmbH; ComponentLink1 Description: Manufacturer; ComponentLink2 Description: Datasheet; NoPins: 22; Created Date: 18 April 2013; partNo: 690357282276; ComponentLink1URL: http://www.we-online.com; ComponentLink2URL: http://katalog.we-online.de/em/datasheet/69035728xx76.pdf; Created by: Karrer Zheng
footprint 690357282276 (22 pins, SMT, straight)
pins: 1, 2, 3, 4, 5, 6, 7, 8, 9, 10, 11, 12, 13, 14, 15, 16, 17, 18, 19, 20, 21, 22

## WE-WR-MM Male SMT Connector 690357282476
designator C?
WR-MM Male SMT Connector; Manufacturer: Würth Elektronik eiSos GmbH; ComponentLink1 Description: Manufacturer; ComponentLink2 Description: Datasheet; NoPins: 24; Created Date: 18 April 2013; partNo: 690357282476; ComponentLink1URL: http://www.we-online.com; ComponentLink2URL: http://katalog.we-online.de/em/datasheet/69035728xx76.pdf; Created by: Karrer Zheng
footprint 690357282476 (24 pins, SMT, straight)
pins: 1, 2, 3, 4, 5, 6, 7, 8, 9, 10, 11, 12, 13, 14, 15, 16, 17, 18, 19, 20, 21, 22, 23, 24

## WE-WR-MM Male SMT Connector 690357282676
designator C?
WR-MM Male SMT Connector; Manufacturer: Würth Elektronik eiSos GmbH; ComponentLink1 Description: Manufacturer; ComponentLink2 Description: Datasheet; NoPins: 26; Created Date: 18 April 2013; partNo: 690357282676; ComponentLink1URL: http://www.we-online.com; ComponentLink2URL: http://katalog.we-online.de/em/datasheet/69035728xx76.pdf; Created by: Karrer Zheng
footprint 690357282676 (26 pins, SMT, straight)
pins: 1, 2, 3, 4, 5, 6, 7, 8, 9, 10, 11, 12, 13, 14, 15, 16, 17, 18, 19, 20, 21, 22, 23, 24, 25, 26